# Altium footprint library NXP_60_26022015.PCBLIB: 287 footprints (part 5 of 18)
Each footprint in its own frame and in the unit in brackets; x right, y up, seen from the top. Pads: shape width x height; smd on the part's side, far side on the other; paste and mask are expansions set on the pad; w line width, h text height; cw(c..) or ccw(c..) is an arc to the next point about the centre after c.
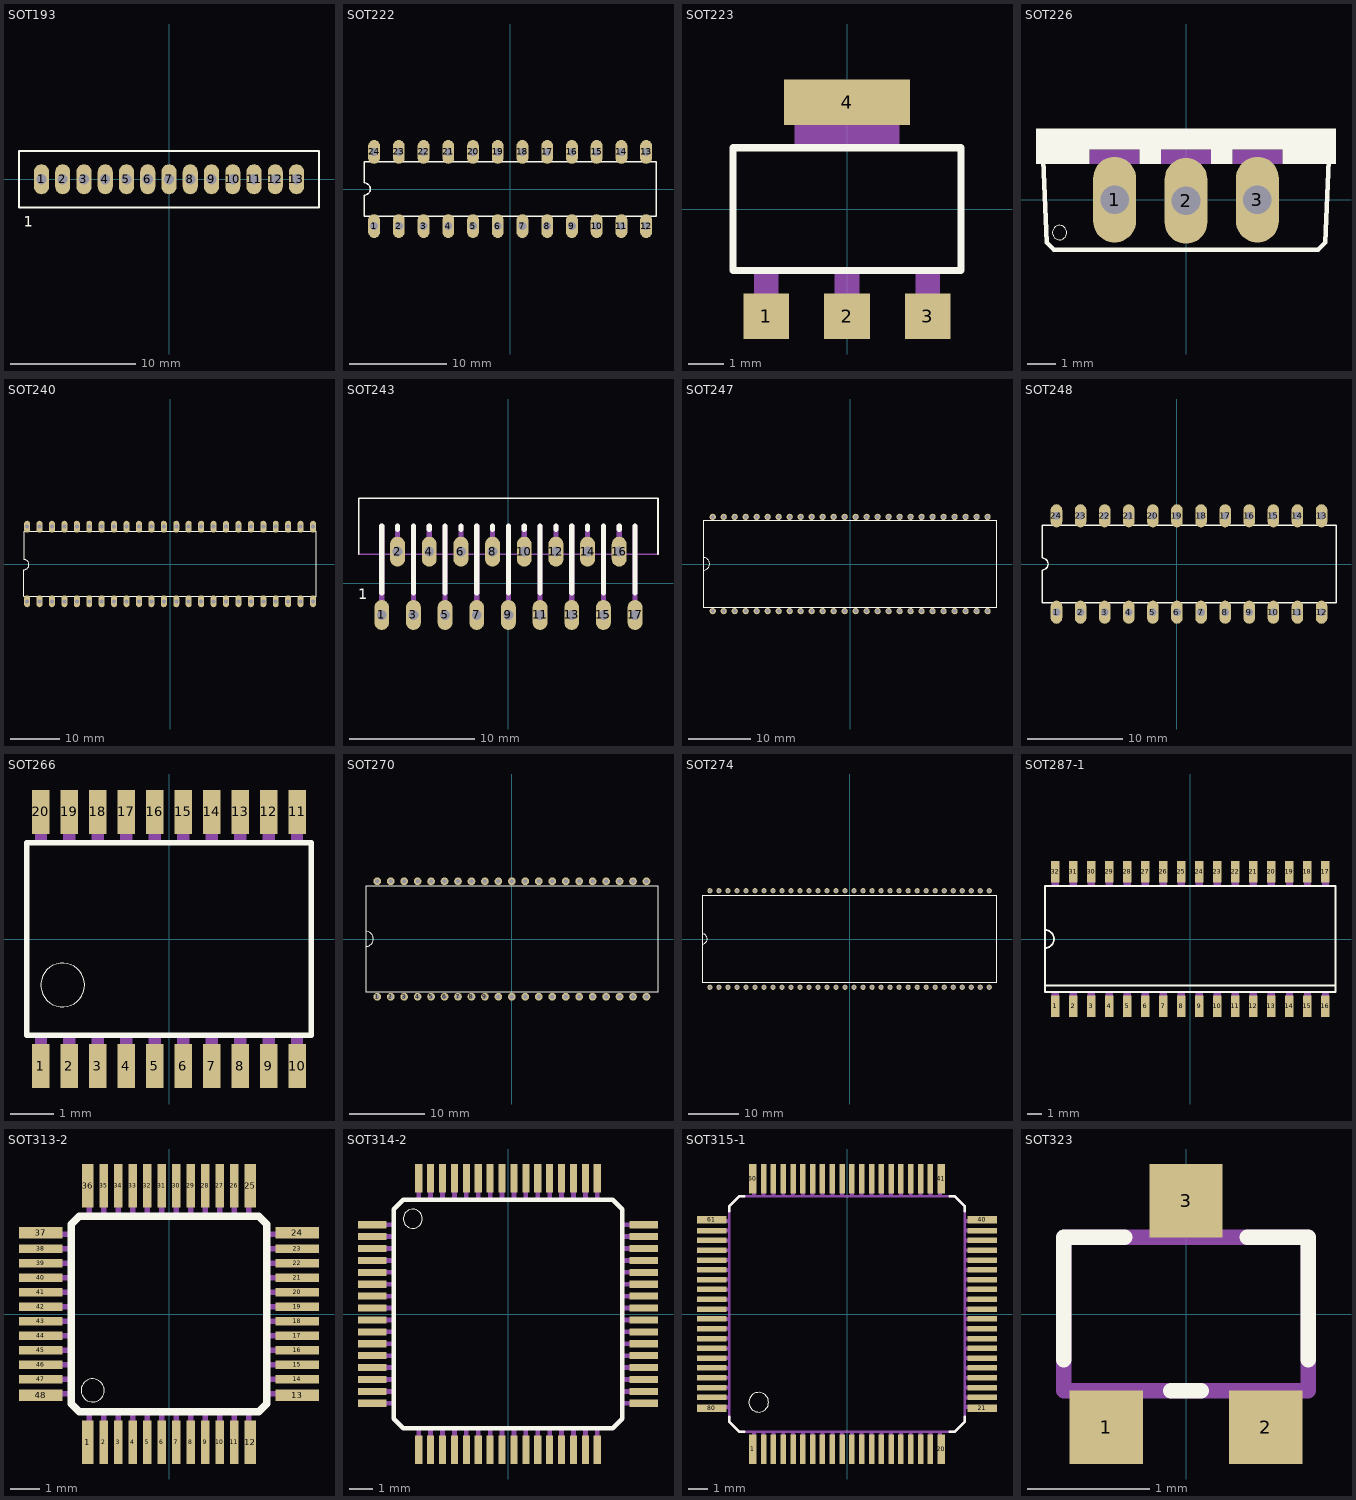
[diagram p4: the footprints below, top view; thin cyan lines are the x and y axes]

## SOT193 [mil]
pads (13):
  oval 47.25x94.5 hole 31.5: 1(-401.57,0) 2(-334.65,0) 3(-267.72,0) 4(-200.79,0) 5(-133.86,0) 6(-66.93,0) 7(0,0) 8(66.93,0) 9(133.86,0) 10(200.79,0) 11(267.72,0) 12(334.65,0) 13(401.57,0)
Top Overlay:
  lines w6: -472.44,-88.58 472.44,-88.58 472.44,88.58 -472.44,88.58 -472.44,-88.58
  text "1" at -457.68,-150 h33.46

## SOT222 [mil]
pads (24):
  oval 48x96 hole 32: 1(-550,-150) 2(-450,-150) 3(-350,-150) 4(-250,-150) 5(-150,-150) 6(-50,-150) 7(50,-150) 8(150,-150) 9(250,-150) 10(350,-150) 11(450,-150) 12(550,-150) 13(550,150) 14(450,150) 15(350,150) 16(250,150) 17(150,150) 18(50,150) 19(-50,150) 20(-150,150) 21(-250,150) 22(-350,150) 23(-450,150) 24(-550,150)
Top Overlay:
  lines w6: -590,-110 -590,-25 ccw(c-590,0) -590,25 -590,110 590,110 590,-110 -590,-110

## SOT223 [mm]
pads (4):
  rect 1.3x1.3 smd: 1(-2.3,-3.05) 2(0,-3.05) 3(2.3,-3.05)
  rect 3.6x1.3 smd: 4(0,3.05)
Top Overlay:
  lines w0.203: -3.25,-1.75 3.25,-1.75 3.25,1.75 -3.25,1.75 -3.25,-1.75
Top Paste:
  rectangle: -1.75,2.45 -0.15,3.65
  rectangle: 0.15,2.45 1.75,3.65
Mechanical 16:
  rectangle: -1.5,1.75 1.5,3.5
  rectangle: -0.35,-3.5 0.35,-1.75
  rectangle: -2.65,-3.5 -1.95,-1.75
  rectangle: 1.95,-3.5 2.65,-1.75

## SOT226 [mil]
pads (3):
  oval 60x120 hole 40: 1(-100,0) 2(0,-1.57) 3(100,0)
Top Overlay:
  circle w0: c-177,-46 r10
  rectangle: -210,70 210,100
  rectangle: -210,50 -135,70
  rectangle: -65,50 -35,70
  rectangle: 35,50 65,70
  rectangle: 135,50 210,70
  lines w6: -200,55 -195,-60 -185,-70 185,-70 195,-60 200,55
Mechanical 16:
  rectangle: -135,50 -65,70
  rectangle: -35,50 35,70
  rectangle: 65,50 135,70

## SOT240 [mil]
pads (48):
  oval 48x96 hole 32: 1(-1150,-300) 2(-1050,-300) 3(-950,-300) 4(-850,-300) 5(-750,-300) 6(-650,-300) 7(-550,-300) 8(-450,-300) 9(-350,-300) 10(-250,-300) 11(-150,-300) 12(-50,-300) 13(50,-300) 14(150,-300) 15(250,-300) 16(350,-300) 17(450,-300) 18(550,-300) 19(650,-300) 20(750,-300) 21(850,-300) 22(950,-300) 23(1050,-300) 24(1150,-300) 25(1150,300) 26(1050,300) 27(950,300) 28(850,300) 29(750,300) 30(650,300) 31(550,300) 32(450,300) 33(350,300) 34(250,300) 35(150,300) 36(50,300) 37(-50,300) 38(-150,300) 39(-250,300) 40(-350,300) 41(-450,300) 42(-550,300) 43(-650,300) 44(-750,300) 45(-850,300) 46(-950,300) 47(-1050,300) 48(-1150,300)
Top Overlay:
  lines w6: -1175,-260 1175,-260 1175,260 -1175,260 -1175,35 cw(c-1175,-5) -1175,-45 -1175,-260

## SOT243 [mil]
pads (17):
  oval 47.25x94.5 hole 31.5: 1(-400,-100) 2(-350,100) 3(-300,-100) 4(-250,100) 5(-200,-100) 6(-150,100) 7(-100,-100) 8(-50,100) 9(0,-100) 10(50,100) 11(100,-100) 12(150,100) 13(200,-100) 14(250,100) 15(300,-100) 16(350,100) 17(400,-100)
Top Overlay:
  lines w5: -472.44,92.13 -472.44,269.29 472.44,269.29 472.44,92.13
  lines w16: -400,-30 -400,180.71 ; -350,170 -350,180.71 ; -300,-30 -300,180.71 ; -250,170 -250,180.71 ; -200,-30 -200,180.71 ; -150,170 -150,180.71 ; -100,-30 -100,180.71 ; -50,170 -50,180.71 ; 0,-30 0,180.71 ; 50,170 50,180.71 ; 100,-30 100,180.71 ; 150,170 150,180.71 ; 200,-30 200,180.71 ; 250,170 250,180.71 ; 300,-30 300,180.71 ; 350,170 350,180.71 ; 400,-30 400,180.71
  text "1" at -475,-50 h33.46
Mechanical 16:
  lines w5: -472.44,92.13 472.44,92.13
  lines w16: -400,-100 -400,180.71 ; -350,100 -350,180.71 ; -300,-100 -300,180.71 ; -250,100 -250,180.71 ; -200,-100 -200,180.71 ; -150,100 -150,180.71 ; -100,-100 -100,180.71 ; -50,100 -50,180.71 ; 0,-100 0,180.71 ; 50,100 50,180.71 ; 100,-100 100,180.71 ; 150,100 150,180.71 ; 200,-100 200,180.71 ; 250,100 250,180.71 ; 300,-100 300,180.71 ; 350,100 350,180.71 ; 400,-100 400,180.71

## SOT247 [mil]
pads (52):
  round 40 hole 24: 1(-875,-300) 2(-805,-300) 3(-735,-300) 4(-665,-300) 5(-595,-300) 6(-525,-300) 7(-455,-300) 8(-385,-300) 9(-315,-300) 10(-245,-300) 11(-175,-300) 12(-105,-300) 13(-35,-300) 14(35,-300) 15(105,-300) 16(175,-300) 17(245,-300) 18(315,-300) 19(385,-300) 20(455,-300) 21(525,-300) 22(595,-300) 23(665,-300) 24(735,-300) 25(805,-300) 26(875,-300) 27(875,300) 28(805,300) 29(735,300) 30(665,300) 31(595,300) 32(525,300) 33(455,300) 34(385,300) 35(315,300) 36(245,300) 37(175,300) 38(105,300) 39(35,300) 40(-35,300) 41(-105,300) 42(-175,300) 43(-245,300) 44(-315,300) 45(-385,300) 46(-455,300) 47(-525,300) 48(-595,300) 49(-665,300) 50(-735,300) 51(-805,300) 52(-875,300)
Top Overlay:
  lines w5: -935.04,-39.5 -935.04,40.5 ; -935.04,-39.5 -935.04,-275.59 935.04,-275.59 935.04,275.59 -935.04,275.59 -935.04,40.5 ; -935.04,-39.5 ccw(c-935.04,0.5) -935.04,40.5

## SOT248 [mil]
pads (24):
  oval 48x96 hole 32: 1(-500,-200) 2(-400,-200) 3(-300,-200) 4(-200,-200) 5(-100,-200) 6(0,-200) 7(100,-200) 8(200,-200) 9(300,-200) 10(400,-200) 11(500,-200) 12(600,-200) 13(600,200) 14(500,200) 15(400,200) 16(300,200) 17(200,200) 18(100,200) 19(0,200) 20(-100,200) 21(-200,200) 22(-300,200) 23(-400,200) 24(-500,200)
Top Overlay:
  lines w6: -560,-160 -560,-25 ccw(c-560,0) -560,25 -560,160 660,160 660,-160 -560,-160

## SOT266 [mm]
pads (20):
  rect 0.4x1 smd: 1(-2.925,-2.9) 2(-2.275,-2.9) 3(-1.625,-2.9) 4(-0.975,-2.9) 5(-0.325,-2.9) 6(0.325,-2.9) 7(0.975,-2.9) 8(1.625,-2.9) 9(2.275,-2.9) 10(2.925,-2.9) 11(2.925,2.9) 12(2.275,2.9) 13(1.625,2.9) 14(0.975,2.9) 15(0.325,2.9) 16(-0.325,2.9) 17(-0.975,2.9) 18(-1.625,2.9) 19(-2.275,2.9) 20(-2.925,2.9)
Top Overlay:
  circle w0: c-2.425,-1.05 r0.5
  lines w0.127: -3.25,-2.2 3.25,-2.2 3.25,2.2 -3.25,2.2 -3.25,-2.2
Mechanical 16:
  rectangle: -1.115,2.2 -0.835,3.2
  rectangle: -1.765,2.2 -1.485,3.2
  rectangle: -3.065,2.2 -2.785,3.2
  rectangle: -2.415,2.2 -2.135,3.2
  rectangle: 1.485,2.2 1.765,3.2
  rectangle: -0.465,2.2 -0.185,3.2
  rectangle: 0.185,2.2 0.465,3.2
  rectangle: 0.835,2.2 1.115,3.2
  rectangle: 0.835,-3.2 1.115,-2.2
  rectangle: 0.185,-3.2 0.465,-2.2
  rectangle: -0.465,-3.2 -0.185,-2.2
  rectangle: -1.115,-3.2 -0.835,-2.2
  rectangle: -1.765,-3.2 -1.485,-2.2
  rectangle: -2.415,-3.2 -2.135,-2.2
  rectangle: -3.065,-3.2 -2.785,-2.2
  rectangle: 2.785,-3.2 3.065,-2.2
  rectangle: 2.135,2.2 2.415,3.2
  rectangle: 2.785,2.2 3.065,3.2
  rectangle: 1.485,-3.2 1.765,-2.2
  rectangle: 2.135,-3.2 2.415,-2.2

## SOT270 [mil]
pads (42):
  round 40 hole 24: 1(-700,-300) 2(-630,-300) 3(-560,-300) 4(-490,-300) 5(-420,-300) 6(-350,-300) 7(-280,-300) 8(-210,-300) 9(-140,-300) 10(-70,-300) 11(0,-300) 12(70,-300) 13(140,-300) 14(210,-300) 15(280,-300) 16(350,-300) 17(420,-300) 18(490,-300) 19(560,-300) 20(630,-300) 21(700,-300) 22(700,300) 23(630,300) 24(560,300) 25(490,300) 26(420,300) 27(350,300) 28(280,300) 29(210,300) 30(140,300) 31(70,300) 32(0,300) 33(-70,300) 34(-140,300) 35(-210,300) 36(-280,300) 37(-350,300) 38(-420,300) 39(-490,300) 40(-560,300) 41(-630,300) 42(-700,300)
Top Overlay:
  lines w5: -760.04,-39.5 -760.04,40.5 ; -760.04,-39.5 -760.04,-275.59 760.04,-275.59 760.04,275.59 -760.04,275.59 -760.04,40.5 ; -760.04,-39.5 ccw(c-760.04,0.5) -760.04,40.5

## SOT274 [mil]
pads (65):
  round 40 hole 24: 1(-1085,-375) 2(-1015,-375) 3(-945,-375) 4(-875,-375) 5(-805,-375) 6(-735,-375) 7(-665,-375) 8(-595,-375) 9(-525,-375) 10(-455,-375) 11(-385,-375) 12(-315,-375) 13(-245,-375) 14(-175,-375) 15(-105,-375) 16(-35,-375) 17(35,-375) 18(105,-375) 19(175,-375) 20(245,-375) 21(315,-375) 22(385,-375) 23(455,-375) 24(525,-375) 25(595,-375) 26(665,-375) 27(735,-375) 28(805,-375) 29(875,-375) 30(945,-375) 31(1015,-375) 32(1085,-375) 33(1085,375) 34(1015,375) 35(945,375) 36(875,375) 37(805,375) 38(735,375) 39(665,375) 40(595,375) 41(525,375) 42(455,375) 43(385,375) 44(315,375) 45(245,375) 46(175,375) 47(105,375) 48(35,375) 49(-35,375) 50(-105,375) 51(-175,375) 52(-245,375) 53(-315,375) 54(-385,375) 55(-455,375) 56(-525,375) 57(-595,375) 58(-665,375) 59(-735,375) 60(-805,375) 61(-875,375) 62(-945,375) 63(-1015,375) 64(-1085,375) 65(-1085,375)
Top Overlay:
  lines w5: -1145.04,-39.5 -1145.04,40.5 ; -1145.04,-39.5 -1145.04,-334.65 1145.04,-334.65 1145.04,334.65 -1145.04,334.65 -1145.04,40.5 ; -1145.04,-39.5 ccw(c-1145.04,0.5) -1145.04,40.5

## SOT287-1 [mm]
pads (32):
  rect 0.6x1.5 smd: 1(-9.525,-4.75) 2(-8.255,-4.75) 3(-6.985,-4.75) 4(-5.715,-4.75) 5(-4.445,-4.75) 6(-3.175,-4.75) 7(-1.905,-4.75) 8(-0.635,-4.75) 9(0.635,-4.75) 10(1.905,-4.75) 11(3.175,-4.75) 12(4.445,-4.75) 13(5.715,-4.75) 14(6.985,-4.75) 15(8.255,-4.75) 16(9.525,-4.75) 17(9.525,4.75) 18(8.255,4.75) 19(6.985,4.75) 20(5.715,4.75) 21(4.445,4.75) 22(3.175,4.75) 23(1.905,4.75) 24(0.635,4.75) 25(-0.635,4.75) 26(-1.905,4.75) 27(-3.175,4.75) 28(-4.445,4.75) 29(-5.715,4.75) 30(-6.985,4.75) 31(-8.255,4.75) 32(-9.525,4.75)
Top Overlay:
  lines w0.127: -10.25,-0.635 ccw(c-10.25,0) -10.25,0.635
  lines w0.152: -10.25,-3.27 -10.25,-0.635 -10.25,0.635 -10.25,3.75 10.25,3.75 10.25,-3.27 ; -10.25,-3.27 -10.25,-3.75 10.25,-3.75 10.25,-3.27 ; -10.25,-3.27 10.25,-3.27
Mechanical 16:
  rectangle: -0.889,3.75 -0.381,4.75
  rectangle: -2.159,3.75 -1.651,4.75
  rectangle: -3.429,3.75 -2.921,4.75
  rectangle: -4.699,3.75 -4.191,4.75
  rectangle: 0.381,3.75 0.889,4.75
  rectangle: 1.651,3.75 2.159,4.75
  rectangle: 2.921,3.75 3.429,4.75
  rectangle: 4.191,3.75 4.699,4.75
  rectangle: -0.889,-4.75 -0.381,-3.75
  rectangle: -2.159,-4.75 -1.651,-3.75
  rectangle: -3.429,-4.75 -2.921,-3.75
  rectangle: -4.699,-4.75 -4.191,-3.75
  rectangle: 0.381,-4.75 0.889,-3.75
  rectangle: 1.651,-4.75 2.159,-3.75
  rectangle: 2.921,-4.75 3.429,-3.75
  rectangle: 4.191,-4.75 4.699,-3.75
  rectangle: 5.461,3.75 5.969,4.75
  rectangle: -5.969,3.75 -5.461,4.75
  rectangle: 5.461,-4.75 5.969,-3.75
  rectangle: -5.969,-4.75 -5.461,-3.75
  rectangle: -7.239,3.75 -6.731,4.75
  rectangle: -8.509,3.75 -8.001,4.75
  rectangle: -7.239,-4.75 -6.731,-3.75
  rectangle: -8.509,-4.75 -8.001,-3.75
  rectangle: 6.731,-4.75 7.239,-3.75
  rectangle: 8.001,-4.75 8.509,-3.75
  rectangle: 6.731,3.75 7.239,4.75
  rectangle: 8.001,3.75 8.509,4.75
  rectangle: -9.779,3.75 -9.271,4.75
  rectangle: 9.271,3.75 9.779,4.75
  rectangle: -9.779,-4.75 -9.271,-3.75
  rectangle: 9.271,-4.75 9.779,-3.75

## SOT313-2 [mm]
pads (48):
  rect 0.4x1.5 smd: 1(-2.81,-4.425) 12(2.81,-4.425) 25(2.81,4.425) 36(-2.81,4.425)
  rect 0.28x1.5 smd: 2(-2.25,-4.425) 3(-1.75,-4.425) 4(-1.25,-4.425) 5(-0.75,-4.425) 6(-0.25,-4.425) 7(0.25,-4.425) 8(0.75,-4.425) 9(1.25,-4.425) 10(1.75,-4.425) 11(2.25,-4.425) 26(2.25,4.425) 27(1.75,4.425) 28(1.25,4.425) 29(0.75,4.425) 30(0.25,4.425) 31(-0.25,4.425) 32(-0.75,4.425) 33(-1.25,4.425) 34(-1.75,4.425) 35(-2.25,4.425)
  rect 1.5x0.4 smd: 13(4.425,-2.81) 24(4.425,2.81) 37(-4.425,2.81) 48(-4.425,-2.81)
  rect 1.5x0.28 smd: 14(4.425,-2.25) 15(4.425,-1.75) 16(4.425,-1.25) 17(4.425,-0.75) 18(4.425,-0.25) 19(4.425,0.25) 20(4.425,0.75) 21(4.425,1.25) 22(4.425,1.75) 23(4.425,2.25) 38(-4.425,2.25) 39(-4.425,1.75) 40(-4.425,1.25) 41(-4.425,0.75) 42(-4.425,0.25) 43(-4.425,-0.25) 44(-4.425,-0.75) 45(-4.425,-1.25) 46(-4.425,-1.75) 47(-4.425,-2.25)
Top Overlay:
  circle w0: c-2.635,-2.635 r0.4
  lines w0.254: -3.375,-3.1 -3.1,-3.375 3.1,-3.375 3.375,-3.1 3.375,3.1 3.1,3.375 -3.1,3.375 -3.375,3.1 -3.375,-3.1
Mechanical 16:
  rectangle: -2.85,-4.5 -2.65,-3.45
  rectangle: -2.35,-4.5 -2.15,-3.45
  rectangle: -1.85,-4.5 -1.65,-3.45
  rectangle: -1.35,-4.5 -1.15,-3.45
  rectangle: -0.85,-4.5 -0.65,-3.45
  rectangle: -0.35,-4.5 -0.15,-3.45
  rectangle: 0.15,-4.5 0.35,-3.45
  rectangle: 0.65,-4.5 0.85,-3.45
  rectangle: 1.15,-4.5 1.35,-3.45
  rectangle: 1.65,-4.5 1.85,-3.45
  rectangle: 2.15,-4.5 2.35,-3.45
  rectangle: 2.65,-4.5 2.85,-3.45
  rectangle: 3.45,-2.85 4.5,-2.65
  rectangle: 3.45,-2.35 4.5,-2.15
  rectangle: 3.45,-1.85 4.5,-1.65
  rectangle: 3.45,-1.35 4.5,-1.15
  rectangle: 3.45,-0.85 4.5,-0.65
  rectangle: 3.45,-0.35 4.5,-0.15
  rectangle: 3.45,0.15 4.5,0.35
  rectangle: 3.45,0.65 4.5,0.85
  rectangle: 3.45,1.15 4.5,1.35
  rectangle: 3.45,1.65 4.5,1.85
  rectangle: 3.45,2.15 4.5,2.35
  rectangle: 3.45,2.65 4.5,2.85
  rectangle: 2.65,3.45 2.85,4.5
  rectangle: 2.15,3.45 2.35,4.5
  rectangle: 1.65,3.45 1.85,4.5
  rectangle: 1.15,3.45 1.35,4.5
  rectangle: 0.65,3.45 0.85,4.5
  rectangle: 0.15,3.45 0.35,4.5
  rectangle: -0.35,3.45 -0.15,4.5
  rectangle: -0.85,3.45 -0.65,4.5
  rectangle: -1.35,3.45 -1.15,4.5
  rectangle: -1.85,3.45 -1.65,4.5
  rectangle: -2.35,3.45 -2.15,4.5
  rectangle: -2.85,3.45 -2.65,4.5
  rectangle: -4.5,2.65 -3.45,2.85
  rectangle: -4.5,2.15 -3.45,2.35
  rectangle: -4.5,1.65 -3.45,1.85
  rectangle: -4.5,1.15 -3.45,1.35
  rectangle: -4.5,0.65 -3.45,0.85
  rectangle: -4.5,0.15 -3.45,0.35
  rectangle: -4.5,-0.35 -3.45,-0.15
  rectangle: -4.5,-0.85 -3.45,-0.65
  rectangle: -4.5,-1.35 -3.45,-1.15
  rectangle: -4.5,-1.85 -3.45,-1.65
  rectangle: -4.5,-2.35 -3.45,-2.15
  rectangle: -4.5,-2.85 -3.45,-2.65

## SOT314-2 [mm]
pads (64):
  rect 1.2x0.3 smd: 1(-5.7,3.75) 2(-5.7,3.25) 3(-5.7,2.75) 4(-5.7,2.25) 5(-5.7,1.75) 6(-5.7,1.25) 7(-5.7,0.75) 8(-5.7,0.25) 9(-5.7,-0.25) 10(-5.7,-0.75) 11(-5.7,-1.25) 12(-5.7,-1.75) 13(-5.7,-2.25) 14(-5.7,-2.75) 15(-5.7,-3.25) 16(-5.7,-3.75) 33(5.7,-3.75) 34(5.7,-3.25) 35(5.7,-2.75) 36(5.7,-2.25) 37(5.7,-1.75) 38(5.7,-1.25) 39(5.7,-0.75) 40(5.7,-0.25) 41(5.7,0.25) 42(5.7,0.75) 43(5.7,1.25) 44(5.7,1.75) 45(5.7,2.25) 46(5.7,2.75) 47(5.7,3.25) 48(5.7,3.75)
  rect 0.3x1.2 smd: 17(-3.75,-5.7) 18(-3.25,-5.7) 19(-2.75,-5.7) 20(-2.25,-5.7) 21(-1.75,-5.7) 22(-1.25,-5.7) 23(-0.75,-5.7) 24(-0.25,-5.7) 25(0.25,-5.7) 26(0.75,-5.7) 27(1.25,-5.7) 28(1.75,-5.7) 29(2.25,-5.7) 30(2.75,-5.7) 31(3.25,-5.7) 32(3.75,-5.7) 49(3.75,5.7) 50(3.25,5.7) 51(2.75,5.7) 52(2.25,5.7) 53(1.75,5.7) 54(1.25,5.7) 55(0.75,5.7) 56(0.25,5.7) 57(-0.25,5.7) 58(-0.75,5.7) 59(-1.25,5.7) 60(-1.75,5.7) 61(-2.25,5.7) 62(-2.75,5.7) 63(-3.25,5.7) 64(-3.75,5.7)
Top Overlay:
  circle w0: c-4,4 r0.4
  lines w0.203: -4.8,-4.4 -4.4,-4.8 4.4,-4.8 4.8,-4.4 4.8,4.4 4.4,4.8 -4.4,4.8 -4.8,4.4 -4.8,-4.4
Mechanical 16:
  rectangle: -6,3.65 -4.8,3.85
  rectangle: -6,3.15 -4.8,3.35
  rectangle: -6,2.65 -4.8,2.85
  rectangle: -6,2.15 -4.8,2.35
  rectangle: -6,1.65 -4.8,1.85
  rectangle: -6,1.15 -4.8,1.35
  rectangle: -6,0.65 -4.8,0.85
  rectangle: -6,0.15 -4.8,0.35
  rectangle: -6,-0.35 -4.8,-0.15
  rectangle: -6,-0.85 -4.8,-0.65
  rectangle: -6,-1.35 -4.8,-1.15
  rectangle: -6,-1.85 -4.8,-1.65
  rectangle: -6,-2.35 -4.8,-2.15
  rectangle: -6,-2.85 -4.8,-2.65
  rectangle: -6,-3.35 -4.8,-3.15
  rectangle: -6,-3.85 -4.8,-3.65
  rectangle: -3.85,-6 -3.65,-4.8
  rectangle: -3.35,-6 -3.15,-4.8
  rectangle: -2.85,-6 -2.65,-4.8
  rectangle: -2.35,-6 -2.15,-4.8
  rectangle: -1.85,-6 -1.65,-4.8
  rectangle: -1.35,-6 -1.15,-4.8
  rectangle: -0.85,-6 -0.65,-4.8
  rectangle: -0.35,-6 -0.15,-4.8
  rectangle: 0.15,-6 0.35,-4.8
  rectangle: 0.65,-6 0.85,-4.8
  rectangle: 1.15,-6 1.35,-4.8
  rectangle: 1.65,-6 1.85,-4.8
  rectangle: 2.15,-6 2.35,-4.8
  rectangle: 2.65,-6 2.85,-4.8
  rectangle: 3.15,-6 3.35,-4.8
  rectangle: 3.65,-6 3.85,-4.8
  rectangle: 4.8,-3.85 6,-3.65
  rectangle: 4.8,-3.35 6,-3.15
  rectangle: 4.8,-2.85 6,-2.65
  rectangle: 4.8,-2.35 6,-2.15
  rectangle: 4.8,-1.85 6,-1.65
  rectangle: 4.8,-1.35 6,-1.15
  rectangle: 4.8,-0.85 6,-0.65
  rectangle: 4.8,-0.35 6,-0.15
  rectangle: 4.8,0.15 6,0.35
  rectangle: 4.8,0.65 6,0.85
  rectangle: 4.8,1.15 6,1.35
  rectangle: 4.8,1.65 6,1.85
  rectangle: 4.8,2.15 6,2.35
  rectangle: 4.8,2.65 6,2.85
  rectangle: 4.8,3.15 6,3.35
  rectangle: 4.8,3.65 6,3.85
  rectangle: 3.65,4.8 3.85,6
  rectangle: 3.15,4.8 3.35,6
  rectangle: 2.65,4.8 2.85,6
  rectangle: 2.15,4.8 2.35,6
  rectangle: 1.65,4.8 1.85,6
  rectangle: 1.15,4.8 1.35,6
  rectangle: 0.65,4.8 0.85,6
  rectangle: 0.15,4.8 0.35,6
  rectangle: -0.35,4.8 -0.15,6
  rectangle: -0.85,4.8 -0.65,6
  rectangle: -1.35,4.8 -1.15,6
  rectangle: -1.85,4.8 -1.65,6
  rectangle: -2.35,4.8 -2.15,6
  rectangle: -2.85,4.8 -2.65,6
  rectangle: -3.35,4.8 -3.15,6
  rectangle: -3.85,4.8 -3.65,6

## SOT315-1 [mm]
pads (80):
  rect 0.4x1.5 smd: 1(-4.81,-6.9) 20(4.81,-6.9) 41(4.81,6.9) 60(-4.81,6.9)
  rect 0.28x1.5 smd: 2(-4.25,-6.9) 3(-3.75,-6.9) 4(-3.25,-6.9) 5(-2.75,-6.9) 6(-2.25,-6.9) 7(-1.75,-6.9) 8(-1.25,-6.9) 9(-0.75,-6.9) 10(-0.25,-6.9) 11(0.25,-6.9) 12(0.75,-6.9) 13(1.25,-6.9) 14(1.75,-6.9) 15(2.25,-6.9) 16(2.75,-6.9) 17(3.25,-6.9) 18(3.75,-6.9) 19(4.25,-6.9) 42(4.25,6.9) 43(3.75,6.9) 44(3.25,6.9) 45(2.75,6.9) 46(2.25,6.9) 47(1.75,6.9) 48(1.25,6.9) 49(0.75,6.9) 50(0.25,6.9) 51(-0.25,6.9) 52(-0.75,6.9) 53(-1.25,6.9) 54(-1.75,6.9) 55(-2.25,6.9) 56(-2.75,6.9) 57(-3.25,6.9) 58(-3.75,6.9) 59(-4.25,6.9)
  rect 1.5x0.4 smd: 21(6.9,-4.81) 40(6.9,4.81) 61(-6.9,4.81) 80(-6.9,-4.81)
  rect 1.5x0.28 smd: 22(6.9,-4.25) 23(6.9,-3.75) 24(6.9,-3.25) 25(6.9,-2.75) 26(6.9,-2.25) 27(6.9,-1.75) 28(6.9,-1.25) 29(6.9,-0.75) 30(6.9,-0.25) 31(6.9,0.25) 32(6.9,0.75) 33(6.9,1.25) 34(6.9,1.75) 35(6.9,2.25) 36(6.9,2.75) 37(6.9,3.25) 38(6.9,3.75) 39(6.9,4.25) 62(-6.9,4.25) 63(-6.9,3.75) 64(-6.9,3.25) 65(-6.9,2.75) 66(-6.9,2.25) 67(-6.9,1.75) 68(-6.9,1.25) 69(-6.9,0.75) 70(-6.9,0.25) 71(-6.9,-0.25) 72(-6.9,-0.75) 73(-6.9,-1.25) 74(-6.9,-1.75) 75(-6.9,-2.25) 76(-6.9,-2.75) 77(-6.9,-3.25) 78(-6.9,-3.75) 79(-6.9,-4.25)
Top Overlay:
  circle w0: c-4.5,-4.5 r0.5
  lines w0.127: -6,-5.25 -6,-5.5 -5.5,-6 -5.25,-6 ; -6,5.25 -6,5.5 -5.5,6 -5.25,6 ; 5.25,-6 5.5,-6 6,-5.5 6,-5.25 ; 5.25,6 5.5,6 6,5.5 6,5.25
Mechanical 16:
  rectangle: 0.15,6 0.35,7
  rectangle: 0.65,6 0.85,7
  rectangle: 1.15,6 1.35,7
  rectangle: 1.65,6 1.85,7
  rectangle: 2.15,6 2.35,7
  rectangle: 2.65,6 2.85,7
  rectangle: 3.15,6 3.35,7
  rectangle: 3.65,6 3.85,7
  rectangle: 4.15,6 4.35,7
  rectangle: 4.65,6 4.85,7
  rectangle: -0.35,6 -0.15,7
  rectangle: -0.85,6 -0.65,7
  rectangle: -1.35,6 -1.15,7
  rectangle: -1.85,6 -1.65,7
  rectangle: -2.35,6 -2.15,7
  rectangle: -2.85,6 -2.65,7
  rectangle: -3.35,6 -3.15,7
  rectangle: -3.85,6 -3.65,7
  rectangle: -4.35,6 -4.15,7
  rectangle: -4.85,6 -4.65,7
  region: 7,0.15 7,0.35 6,0.35 6,0.15
  region: 7,0.65 7,0.85 6,0.85 6,0.65
  region: 7,1.15 7,1.35 6,1.35 6,1.15
  region: 7,1.65 7,1.85 6,1.85 6,1.65
  region: 7,2.15 7,2.35 6,2.35 6,2.15
  region: 7,2.65 7,2.85 6,2.85 6,2.65
  region: 7,3.15 7,3.35 6,3.35 6,3.15
  region: 7,3.65 7,3.85 6,3.85 6,3.65
  region: 7,4.15 7,4.35 6,4.35 6,4.15
  region: 7,4.65 7,4.85 6,4.85 6,4.65
  region: 7,-0.35 7,-0.15 6,-0.15 6,-0.35
  region: 7,-0.85 7,-0.65 6,-0.65 6,-0.85
  region: 7,-1.35 7,-1.15 6,-1.15 6,-1.35
  region: 7,-1.85 7,-1.65 6,-1.65 6,-1.85
  region: 7,-2.35 7,-2.15 6,-2.15 6,-2.35
  region: 7,-2.85 7,-2.65 6,-2.65 6,-2.85
  region: 7,-3.35 7,-3.15 6,-3.15 6,-3.35
  region: 7,-3.85 7,-3.65 6,-3.65 6,-3.85
  region: 7,-4.35 7,-4.15 6,-4.15 6,-4.35
  region: 7,-4.85 7,-4.65 6,-4.65 6,-4.85
  rectangle: 0.15,-7 0.35,-6
  rectangle: 0.65,-7 0.85,-6
  rectangle: 1.15,-7 1.35,-6
  rectangle: 1.65,-7 1.85,-6
  rectangle: 2.15,-7 2.35,-6
  rectangle: 2.65,-7 2.85,-6
  rectangle: 3.15,-7 3.35,-6
  rectangle: 3.65,-7 3.85,-6
  rectangle: 4.15,-7 4.35,-6
  rectangle: 4.65,-7 4.85,-6
  rectangle: -0.35,-7 -0.15,-6
  rectangle: -0.85,-7 -0.65,-6
  rectangle: -1.35,-7 -1.15,-6
  rectangle: -1.85,-7 -1.65,-6
  rectangle: -2.35,-7 -2.15,-6
  rectangle: -2.85,-7 -2.65,-6
  rectangle: -3.35,-7 -3.15,-6
  rectangle: -3.85,-7 -3.65,-6
  rectangle: -4.35,-7 -4.15,-6
  rectangle: -4.85,-7 -4.65,-6
  region: -6,0.15 -6,0.35 -7,0.35 -7,0.15
  region: -6,0.65 -6,0.85 -7,0.85 -7,0.65
  region: -6,1.15 -6,1.35 -7,1.35 -7,1.15
  region: -6,1.65 -6,1.85 -7,1.85 -7,1.65
  region: -6,2.15 -6,2.35 -7,2.35 -7,2.15
  region: -6,2.65 -6,2.85 -7,2.85 -7,2.65
  region: -6,3.15 -6,3.35 -7,3.35 -7,3.15
  region: -6,3.65 -6,3.85 -7,3.85 -7,3.65
  region: -6,4.15 -6,4.35 -7,4.35 -7,4.15
  region: -6,4.65 -6,4.85 -7,4.85 -7,4.65
  region: -6,-0.35 -6,-0.15 -7,-0.15 -7,-0.35
  region: -6,-0.85 -6,-0.65 -7,-0.65 -7,-0.85
  region: -6,-1.35 -6,-1.15 -7,-1.15 -7,-1.35
  region: -6,-1.85 -6,-1.65 -7,-1.65 -7,-1.85
  region: -6,-2.35 -6,-2.15 -7,-2.15 -7,-2.35
  region: -6,-2.85 -6,-2.65 -7,-2.65 -7,-2.85
  region: -6,-3.35 -6,-3.15 -7,-3.15 -7,-3.35
  region: -6,-3.85 -6,-3.65 -7,-3.65 -7,-3.85
  region: -6,-4.35 -6,-4.15 -7,-4.15 -7,-4.35
  region: -6,-4.85 -6,-4.65 -7,-4.65 -7,-4.85
  lines w0.127: -6,-5.5 -5.5,-6 5.5,-6 6,-5.5 6,5.5 5.5,6 -5.5,6 -6,5.5 -6,-5.5

## SOT323 [mm]
pads (3):
  rect 0.6x0.6 smd: 1(-0.65,-0.925) 2(0.65,-0.925) 3(0,0.925)
Top Overlay:
  lines w0.127: -1,-0.375 -1,0.625 -0.5,0.625 ; -0.125,-0.625 0.125,-0.625 ; 0.5,0.625 1,0.625 1,-0.375
Mechanical 16:
  region: 0.45,-0.625 0.45,-0.925 0.85,-0.925 0.85,-0.625
  region: -0.85,-0.625 -0.85,-0.925 -0.45,-0.925 -0.45,-0.625
  region: -0.2,0.925 -0.2,0.625 0.2,0.625 0.2,0.925
  lines w0.127: -1,-0.625 1,-0.625 1,0.625 -1,0.625 -1,-0.625